# Altium footprint library YQPOWER.PcbLib: 215 footprints (part 2 of 14)
Each footprint in its own frame and in the unit in brackets; x right, y up, seen from the top. Pads: shape width x height; smd on the part's side, far side on the other; paste and mask are expansions set on the pad; w line width, h text height; cw(c..) or ccw(c..) is an arc to the next point about the centre after c.
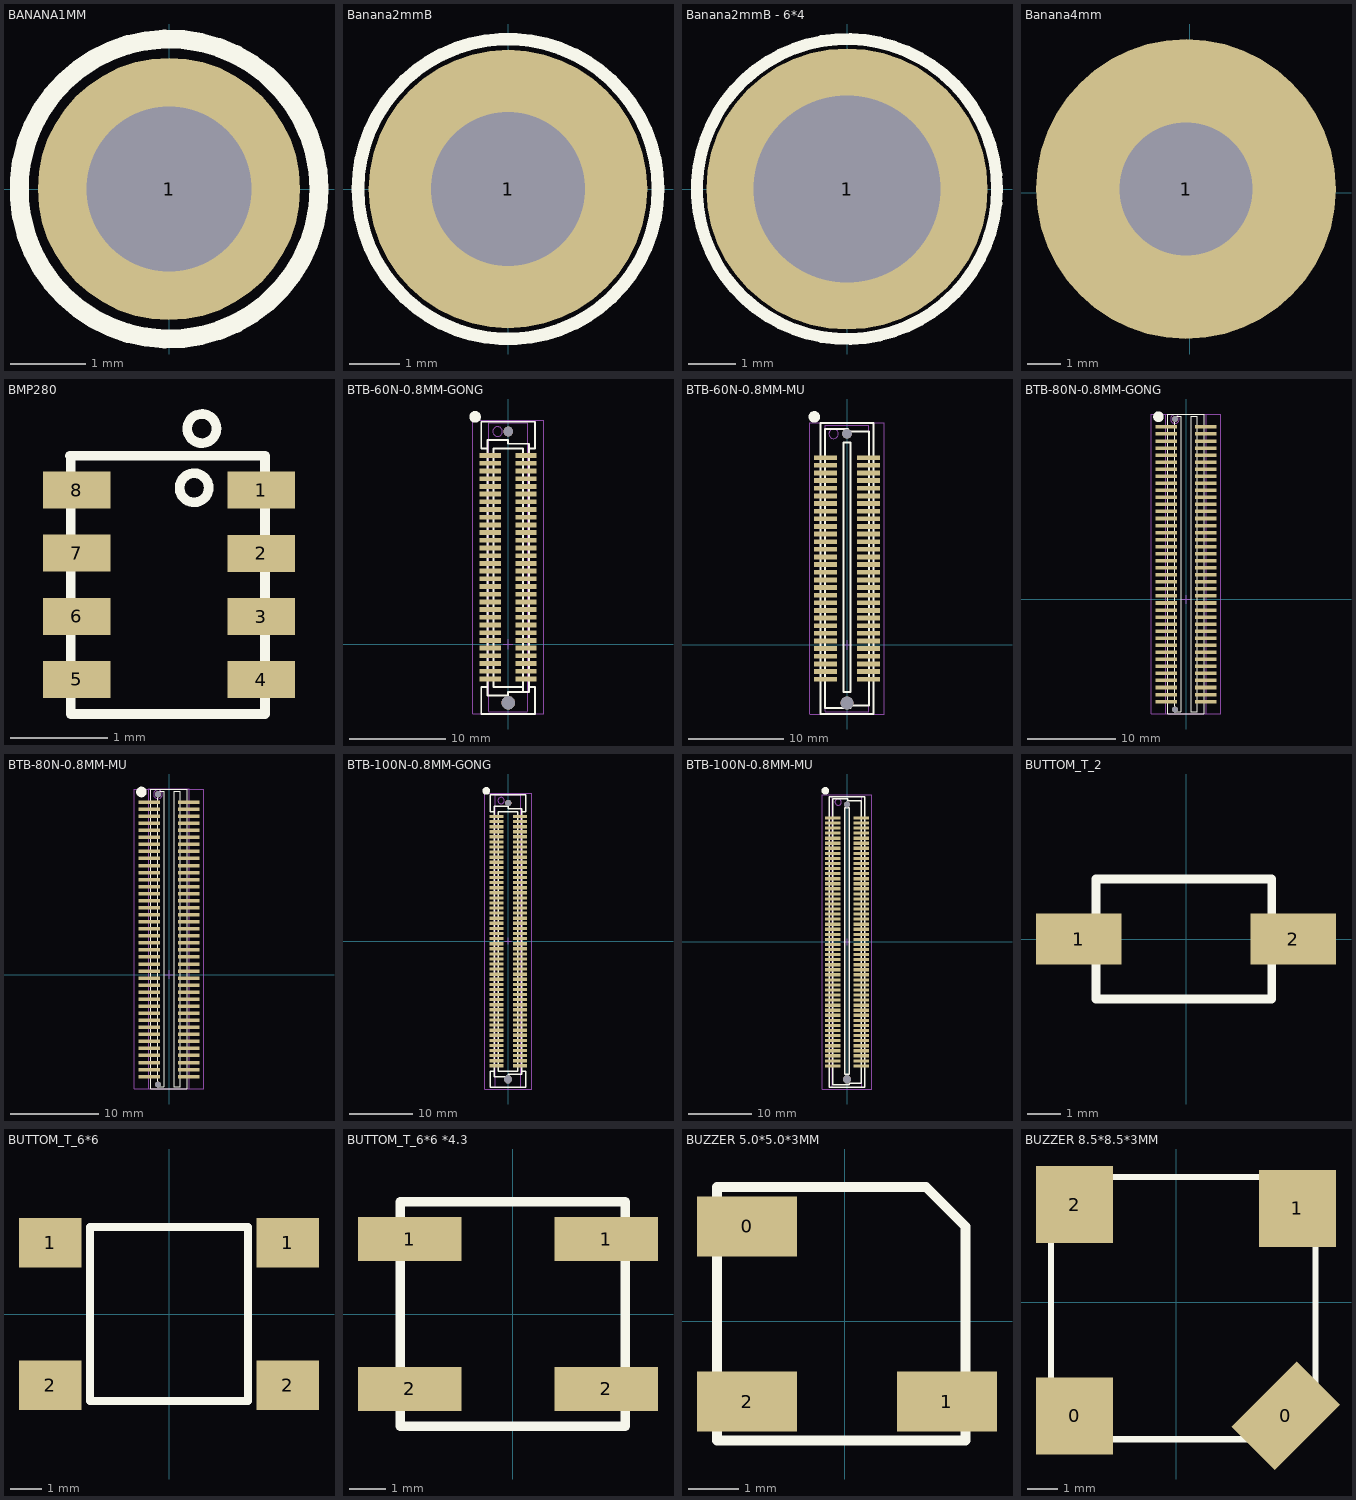
[diagram p1: the footprints below, top view; thin cyan lines are the x and y axes]

## BANANA1MM [mm]
pads (1):
  round 3.5 hole 2.2: 1(0,0)
Top Overlay:
  circle w0.254: c0,0 r2

## Banana2mmB [mm]
pads (1):
  round 5.5 hole 3.05: 1(0,0)
Top Overlay:
  circle w0.254: c0,0 r2.962

## Banana2mmB - 6*4 [mm]
pads (1):
  round 6 hole 4: 1(0,0)
Top Overlay:
  circle w0.254: c0,0 r3.2

## Banana4mm [mm]
pads (1):
  round 9 hole 4: 1(-0.115,0.113)

## BMP280 [mil]
height 100
pads (8):
  rect 27.56x15 smd: 1(109.5,166.4) 2(109.5,140.7) 3(109.5,115.1) 4(109.5,89.5) 5(34.69,89.6) 6(34.69,115.2) 7(34.69,140.8) 8(34.69,166.4)
Top Overlay:
  circle w3.94: c82.28,167.32 r5.91
  circle w3.94: c85.43,191.34 r5.91
  lines w3.94: 31.89,180.31 110.63,180.31 ; 32.28,179.92 32.28,75.59 111.02,75.59 111.02,180.31

## BTB-60N-0.8MM-GONG [mm]
height 5
pads (60):
  rect 2.22x0.5 smd: 1(-1.85,19.6) 2(-1.85,18.8) 3(-1.85,18) 4(-1.85,17.2) 5(-1.85,16.4) 6(-1.85,15.6) 7(-1.85,14.8) 8(-1.85,14) 9(-1.85,13.2) 10(-1.85,12.4) 11(-1.85,11.6) 12(-1.85,10.8) 13(-1.85,10) 14(-1.85,9.2) 15(-1.85,8.4) 16(-1.85,7.6) 17(-1.85,6.8) 18(-1.85,6) 19(-1.85,5.2) 20(-1.85,4.4) 21(-1.85,3.6) 22(-1.85,2.8) 23(-1.85,2) 24(-1.85,1.2) 25(-1.85,0.4) 26(-1.85,-0.4) 27(-1.85,-1.2) 28(-1.85,-2) 29(-1.85,-2.8) 30(-1.85,-3.6) 31(1.85,-3.6) 32(1.85,-2.8) 33(1.85,-2) 34(1.85,-1.2) 35(1.85,-0.4) 36(1.85,0.4) 37(1.85,1.2) 38(1.85,2) 39(1.85,2.8) 40(1.85,3.6) 41(1.85,4.4) 42(1.85,5.2) 43(1.85,6) 44(1.85,6.8) 45(1.85,7.6) 46(1.85,8.4) 47(1.85,9.2) 48(1.85,10) 49(1.85,10.8) 50(1.85,11.6) 51(1.85,12.4) 52(1.85,13.2) 53(1.85,14) 54(1.85,14.8) 55(1.85,15.6) 56(1.85,16.4) 57(1.85,17.2) 58(1.85,18) 59(1.85,18.8) 60(1.85,19.6)
via 0,22.098 diameter 1 hole 1
via 0,-6.096 diameter 1.4 hole 1.4
Top Overlay:
  circle w0.6: c-3.429,23.622 r0.3
  lines w0.2: -2.159,-4.445 -2.794,-4.445 -2.794,-7.239 2.794,-7.239 2.794,-4.445 2.159,-4.445 ; -2.159,20.32 -2.794,20.32 -2.794,23.114 2.794,23.114 2.794,20.32 2.159,20.32 ; 1.524,-4.953 1.524,20.32 -1.524,20.32 -1.524,-4.445 1.524,-4.445 ; -2.159,-5.334 -2.159,21.209 0,21.209 0,20.828 2.159,20.828 2.159,-4.953 0,-4.953 0,-5.334 -2.159,-5.334
Mechanical 13:
  circle w0.1: c-1.1,22.1 r0.5
  lines w0.1: -2,-6.998 2,-6.998 ; -2,-6.985 -2,22.987 2,22.987 2,-6.985
Mechanical 15:
  lines w0.05: -3.7,-7.248 3.7,-7.248 ; -3.7,-7.239 -3.7,23.25 3.7,23.25 3.7,-7.239
  lines w0.1: -0.5,0 0.5,0 ; 0,-0.5 0,0.5
3D body: height 5, standoff 0.1, extent -2,-6.985 2,23

## BTB-60N-0.8MM-MU [mm] "SOP, 60-Leads, Body 45.95x4.55mm, Pitch 0.80mm, IPC Medium Density"
height 5
pads (60):
  rect 2.44x0.5 smd: 1(-2.25,19.6) 2(-2.25,18.8) 3(-2.25,18) 4(-2.25,17.2) 5(-2.25,16.4) 6(-2.25,15.6) 7(-2.25,14.8) 8(-2.25,14) 9(-2.25,13.2) 10(-2.25,12.4) 11(-2.25,11.6) 12(-2.25,10.8) 13(-2.25,10) 14(-2.25,9.2) 15(-2.25,8.4) 16(-2.25,7.6) 17(-2.25,6.8) 18(-2.25,6) 19(-2.25,5.2) 20(-2.25,4.4) 21(-2.25,3.6) 22(-2.25,2.8) 23(-2.25,2) 24(-2.25,1.2) 25(-2.25,0.4) 26(-2.25,-0.4) 27(-2.25,-1.2) 28(-2.25,-2) 29(-2.25,-2.8) 30(-2.25,-3.6) 31(2.25,-3.6) 32(2.25,-2.8) 33(2.25,-2) 34(2.25,-1.2) 35(2.25,-0.4) 36(2.25,0.4) 37(2.25,1.2) 38(2.25,2) 39(2.25,2.8) 40(2.25,3.6) 41(2.25,4.4) 42(2.25,5.2) 43(2.25,6) 44(2.25,6.8) 45(2.25,7.6) 46(2.25,8.4) 47(2.25,9.2) 48(2.25,10) 49(2.25,10.8) 50(2.25,11.6) 51(2.25,12.4) 52(2.25,13.2) 53(2.25,14) 54(2.25,14.8) 55(2.25,15.6) 56(2.25,16.4) 57(2.25,17.2) 58(2.25,18) 59(2.25,18.8) 60(2.25,19.6)
via 0,-6.096 diameter 1.4 hole 1.4
via 0,22.098 diameter 1 hole 1
Top Overlay:
  circle w0.6: c-3.429,23.876 r0.3
  lines w0.2: -2.286,-6.606 0.381,-6.606 0.381,-6.352 2.286,-6.352 ; -2.286,-6.604 -2.286,22.352 -2.286,22.606 0.127,22.606 0.127,22.352 2.286,22.352 2.286,-6.35 ; -0.381,-4.826 -0.381,21.209 0.381,21.209 0.381,-4.953 ; -0.254,-4.955 -0.381,-4.955 0.381,-4.955 ; -2.794,-7.239 2.794,-7.239 2.794,23.241 -2.794,23.241 -2.794,-7.239
Mechanical 13:
  circle w0.1: c-1.4,22.1 r0.5
  lines w0.1: -2.3,-7 2.3,-7 ; -2.3,-6.985 -2.3,22.987 2.3,22.987 2.3,-6.985
Mechanical 15:
  lines w0.05: -3.925,-7.25 3.925,-7.25 ; -3.925,-7.239 -3.925,23.25 3.925,23.25 3.925,-7.239
  lines w0.1: -0.5,0 0.5,0 ; 0,-0.5 0,0.5
3D body: height 5, standoff 0.1, extent -2.3,-6.985 2.3,23

## BTB-80N-0.8MM-GONG [mm] "SOP, 100-Leads, Body 45.95x4.55mm, Pitch 0.80mm, IPC Medium Density"
height 5
pads (80):
  rect 2.44x0.4 smd: 1(-2.25,19.6) 2(-2.25,18.8) 3(-2.25,18) 4(-2.25,17.2) 5(-2.25,16.4) 6(-2.25,15.6) 7(-2.25,14.8) 8(-2.25,14) 9(-2.25,13.2) 10(-2.25,12.4) 11(-2.25,11.6) 12(-2.25,10.8) 13(-2.25,10) 14(-2.25,9.2) 15(-2.25,8.4) 16(-2.25,7.6) 17(-2.25,6.8) 18(-2.25,6) 19(-2.25,5.2) 20(-2.25,4.4) 21(-2.25,3.6) 22(-2.25,2.8) 23(-2.25,2) 24(-2.25,1.2) 25(-2.25,0.4) 26(-2.25,-0.4) 27(-2.25,-1.2) 28(-2.25,-2) 29(-2.25,-2.8) 30(-2.25,-3.6) 31(-2.25,-4.4) 32(-2.25,-5.2) 33(-2.25,-6) 34(-2.25,-6.8) 35(-2.25,-7.6) 36(-2.25,-8.4) 37(-2.25,-9.2) 38(-2.25,-10) 39(-2.25,-10.8) 40(-2.25,-11.6) 41(2.25,-11.6) 42(2.25,-10.8) 43(2.25,-10) 44(2.25,-9.2) 45(2.25,-8.4) 46(2.25,-7.6) 47(2.25,-6.8) 48(2.25,-6) 49(2.25,-5.2) 50(2.25,-4.4) 51(2.25,-3.6) 52(2.25,-2.8) 53(2.25,-2) 54(2.25,-1.2) 55(2.25,-0.4) 56(2.25,0.4) 57(2.25,1.2) 58(2.25,2) 59(2.25,2.8) 60(2.25,3.6) 61(2.25,4.4) 62(2.25,5.2) 63(2.25,6) 64(2.25,6.8) 65(2.25,7.6) 66(2.25,8.4) 67(2.25,9.2) 68(2.25,10) 69(2.25,10.8) 70(2.25,11.6) 71(2.25,12.4) 72(2.25,13.2) 73(2.25,14) 74(2.25,14.8) 75(2.25,15.6) 76(2.25,16.4) 77(2.25,17.2) 78(2.25,18) 79(2.25,18.8) 80(2.25,19.6)
via -1.25,-12.5 diameter 0.7 hole 0.7
via -1.25,20.5 diameter 0.7 hole 0.7
Top Overlay:
  circle w0.6: c-3.13,20.76 r0.3
  lines w0.1: -2.05,-13.01 2.02,-13.01 2.02,21.07 -2.05,21.07 -2.05,-13.01 ; -1.31,-12.75 -1.31,20.83 -0.57,20.83 -0.57,-12.75 -1.31,-12.75 ; 0.52,-12.75 0.52,20.83 1.285,20.83 1.285,-12.75 0.52,-12.75
Mechanical 13:
  circle w0.1: c-1.25,20.5 r0.5
  lines w0.1: -2.3,-12.99 2.3,-12.99 2.3,21.06 -2.3,21.06 -2.3,-12.99
Mechanical 15:
  lines w0.05: -3.925,-12.97 3.925,-12.97 3.925,21.07 -3.925,21.07 -3.925,-12.97
  lines w0.1: -0.5,0 0.5,0 ; 0,-0.5 0,0.5
3D body: height 5, standoff 0.1, extent -2.3,-12.99 2.3,21.07

## BTB-80N-0.8MM-MU [mm] "SOP, 100-Leads, Body 45.95x4.55mm, Pitch 0.80mm, IPC Medium Density"
height 5
pads (80):
  rect 2.44x0.4 smd: 1(-2.25,19.6) 2(-2.25,18.8) 3(-2.25,18) 4(-2.25,17.2) 5(-2.25,16.4) 6(-2.25,15.6) 7(-2.25,14.8) 8(-2.25,14) 9(-2.25,13.2) 10(-2.25,12.4) 11(-2.25,11.6) 12(-2.25,10.8) 13(-2.25,10) 14(-2.25,9.2) 15(-2.25,8.4) 16(-2.25,7.6) 17(-2.25,6.8) 18(-2.25,6) 19(-2.25,5.2) 20(-2.25,4.4) 21(-2.25,3.6) 22(-2.25,2.8) 23(-2.25,2) 24(-2.25,1.2) 25(-2.25,0.4) 26(-2.25,-0.4) 27(-2.25,-1.2) 28(-2.25,-2) 29(-2.25,-2.8) 30(-2.25,-3.6) 31(-2.25,-4.4) 32(-2.25,-5.2) 33(-2.25,-6) 34(-2.25,-6.8) 35(-2.25,-7.6) 36(-2.25,-8.4) 37(-2.25,-9.2) 38(-2.25,-10) 39(-2.25,-10.8) 40(-2.25,-11.6) 41(2.25,-11.6) 42(2.25,-10.8) 43(2.25,-10) 44(2.25,-9.2) 45(2.25,-8.4) 46(2.25,-7.6) 47(2.25,-6.8) 48(2.25,-6) 49(2.25,-5.2) 50(2.25,-4.4) 51(2.25,-3.6) 52(2.25,-2.8) 53(2.25,-2) 54(2.25,-1.2) 55(2.25,-0.4) 56(2.25,0.4) 57(2.25,1.2) 58(2.25,2) 59(2.25,2.8) 60(2.25,3.6) 61(2.25,4.4) 62(2.25,5.2) 63(2.25,6) 64(2.25,6.8) 65(2.25,7.6) 66(2.25,8.4) 67(2.25,9.2) 68(2.25,10) 69(2.25,10.8) 70(2.25,11.6) 71(2.25,12.4) 72(2.25,13.2) 73(2.25,14) 74(2.25,14.8) 75(2.25,15.6) 76(2.25,16.4) 77(2.25,17.2) 78(2.25,18) 79(2.25,18.8) 80(2.25,19.6)
via -1.25,-12.5 diameter 0.7 hole 0.7
via -1.25,20.5 diameter 0.7 hole 0.7
Top Overlay:
  circle w0.6: c-3.13,20.76 r0.3
  lines w0.1: -2.05,-13.01 2.02,-13.01 2.02,21.07 -2.05,21.07 -2.05,-13.01 ; -1.31,-12.75 -1.31,20.83 -0.57,20.83 -0.57,-12.75 -1.31,-12.75 ; 0.52,-12.75 0.52,20.83 1.285,20.83 1.285,-12.75 0.52,-12.75
Mechanical 13:
  circle w0.1: c-1.25,20.5 r0.5
  lines w0.1: -2.3,-12.96 2.3,-12.96 2.3,21.1 -2.3,21.1 -2.3,-12.96
Mechanical 15:
  lines w0.05: -3.925,-13.01 3.925,-13.01 3.925,21.07 -3.925,21.07 -3.925,-13.01
  lines w0.1: -0.5,0 0.5,0 ; 0,-0.5 0,0.5

## BTB-100N-0.8MM-GONG [mm]
height 5
pads (100):
  rect 2.22x0.5 smd: 1(-1.85,19.6) 2(-1.85,18.8) 3(-1.85,18) 4(-1.85,17.2) 5(-1.85,16.4) 6(-1.85,15.6) 7(-1.85,14.8) 8(-1.85,14) 9(-1.85,13.2) 10(-1.85,12.4) 11(-1.85,11.6) 12(-1.85,10.8) 13(-1.85,10) 14(-1.85,9.2) 15(-1.85,8.4) 16(-1.85,7.6) 17(-1.85,6.8) 18(-1.85,6) 19(-1.85,5.2) 20(-1.85,4.4) 21(-1.85,3.6) 22(-1.85,2.8) 23(-1.85,2) 24(-1.85,1.2) 25(-1.85,0.4) 26(-1.85,-0.4) 27(-1.85,-1.2) 28(-1.85,-2) 29(-1.85,-2.8) 30(-1.85,-3.6) 31(-1.85,-4.4) 32(-1.85,-5.2) 33(-1.85,-6) 34(-1.85,-6.8) 35(-1.85,-7.6) 36(-1.85,-8.4) 37(-1.85,-9.2) 38(-1.85,-10) 39(-1.85,-10.8) 40(-1.85,-11.6) 41(-1.85,-12.4) 42(-1.85,-13.2) 43(-1.85,-14) 44(-1.85,-14.8) 45(-1.85,-15.6) 46(-1.85,-16.4) 47(-1.85,-17.2) 48(-1.85,-18) 49(-1.85,-18.8) 50(-1.85,-19.6) 51(1.85,-19.6) 52(1.85,-18.8) 53(1.85,-18) 54(1.85,-17.2) 55(1.85,-16.4) 56(1.85,-15.6) 57(1.85,-14.8) 58(1.85,-14) 59(1.85,-13.2) 60(1.85,-12.4) 61(1.85,-11.6) 62(1.85,-10.8) 63(1.85,-10) 64(1.85,-9.2) 65(1.85,-8.4) 66(1.85,-7.6) 67(1.85,-6.8) 68(1.85,-6) 69(1.85,-5.2) 70(1.85,-4.4) 71(1.85,-3.6) 72(1.85,-2.8) 73(1.85,-2) 74(1.85,-1.2) 75(1.85,-0.4) 76(1.85,0.4) 77(1.85,1.2) 78(1.85,2) 79(1.85,2.8) 80(1.85,3.6) 81(1.85,4.4) 82(1.85,5.2) 83(1.85,6) 84(1.85,6.8) 85(1.85,7.6) 86(1.85,8.4) 87(1.85,9.2) 88(1.85,10) 89(1.85,10.8) 90(1.85,11.6) 91(1.85,12.4) 92(1.85,13.2) 93(1.85,14) 94(1.85,14.8) 95(1.85,15.6) 96(1.85,16.4) 97(1.85,17.2) 98(1.85,18) 99(1.85,18.8) 100(1.85,19.6)
via 0,-21.717 diameter 1.3 hole 1.3
via 0,21.717 diameter 1 hole 1
Top Overlay:
  circle w0.6: c-3.429,23.622 r0.3
  lines w0.2: -2.159,-20.447 -2.794,-20.447 -2.794,-22.987 2.794,-22.987 2.794,-20.447 2.159,-20.447 ; -2.159,20.32 -2.794,20.32 -2.794,22.987 2.794,22.987 2.794,20.32 2.159,20.32 ; -2.159,-21.336 0,-21.336 0,-20.955 2.159,-20.955 2.159,20.828 0,20.828 0,21.209 -2.159,21.209 -2.159,-21.336 ; -1.524,-20.447 -1.524,20.32 1.524,20.32 1.524,-20.447 -1.524,-20.447
Mechanical 13:
  circle w0.1: c-1.1,22.1 r0.5
  lines w0.1: -2,-23 2,-23 2,23 -2,23 -2,-23
Mechanical 15:
  lines w0.05: -3.7,-23.25 3.7,-23.25 3.7,23.25 -3.7,23.25 -3.7,-23.25
  lines w0.1: -0.5,0 0.5,0 ; 0,-0.5 0,0.5
3D body: height 5, standoff 0.1, extent -2,-23 2,23

## BTB-100N-0.8MM-MU [mm] "SOP, 100-Leads, Body 45.95x4.55mm, Pitch 0.80mm, IPC Medium Density"
height 5
pads (100):
  rect 2.44x0.5 smd: 1(-2.25,19.6) 2(-2.25,18.8) 3(-2.25,18) 4(-2.25,17.2) 5(-2.25,16.4) 6(-2.25,15.6) 7(-2.25,14.8) 8(-2.25,14) 9(-2.25,13.2) 10(-2.25,12.4) 11(-2.25,11.6) 12(-2.25,10.8) 13(-2.25,10) 14(-2.25,9.2) 15(-2.25,8.4) 16(-2.25,7.6) 17(-2.25,6.8) 18(-2.25,6) 19(-2.25,5.2) 20(-2.25,4.4) 21(-2.25,3.6) 22(-2.25,2.8) 23(-2.25,2) 24(-2.25,1.2) 25(-2.25,0.4) 26(-2.25,-0.4) 27(-2.25,-1.2) 28(-2.25,-2) 29(-2.25,-2.8) 30(-2.25,-3.6) 31(-2.25,-4.4) 32(-2.25,-5.2) 33(-2.25,-6) 34(-2.25,-6.8) 35(-2.25,-7.6) 36(-2.25,-8.4) 37(-2.25,-9.2) 38(-2.25,-10) 39(-2.25,-10.8) 40(-2.25,-11.6) 41(-2.25,-12.4) 42(-2.25,-13.2) 43(-2.25,-14) 44(-2.25,-14.8) 45(-2.25,-15.6) 46(-2.25,-16.4) 47(-2.25,-17.2) 48(-2.25,-18) 49(-2.25,-18.8) 50(-2.25,-19.6) 51(2.25,-19.6) 52(2.25,-18.8) 53(2.25,-18) 54(2.25,-17.2) 55(2.25,-16.4) 56(2.25,-15.6) 57(2.25,-14.8) 58(2.25,-14) 59(2.25,-13.2) 60(2.25,-12.4) 61(2.25,-11.6) 62(2.25,-10.8) 63(2.25,-10) 64(2.25,-9.2) 65(2.25,-8.4) 66(2.25,-7.6) 67(2.25,-6.8) 68(2.25,-6) 69(2.25,-5.2) 70(2.25,-4.4) 71(2.25,-3.6) 72(2.25,-2.8) 73(2.25,-2) 74(2.25,-1.2) 75(2.25,-0.4) 76(2.25,0.4) 77(2.25,1.2) 78(2.25,2) 79(2.25,2.8) 80(2.25,3.6) 81(2.25,4.4) 82(2.25,5.2) 83(2.25,6) 84(2.25,6.8) 85(2.25,7.6) 86(2.25,8.4) 87(2.25,9.2) 88(2.25,10) 89(2.25,10.8) 90(2.25,11.6) 91(2.25,12.4) 92(2.25,13.2) 93(2.25,14) 94(2.25,14.8) 95(2.25,15.6) 96(2.25,16.4) 97(2.25,17.2) 98(2.25,18) 99(2.25,18.8) 100(2.25,19.6)
via 0,21.717 diameter 1 hole 1
via 0,-21.717 diameter 1.3 hole 1.3
Top Overlay:
  circle w0.6: c-3.429,23.876 r0.3
  lines w0.2: -0.254,-20.955 -0.381,-20.955 ; -0.381,-20.955 -0.381,21.209 0.381,21.209 0.381,-20.955 -0.381,-20.955 ; -2.794,-22.987 2.794,-22.987 2.794,22.987 -2.794,22.987 -2.794,-22.987 ; -2.286,-22.606 -2.286,22.352 -2.286,22.606 0.127,22.606 0.127,22.352 2.286,22.352 2.286,-22.352 0.381,-22.352 0.381,-22.606 -2.286,-22.606
Mechanical 13:
  circle w0.1: c-1.4,22.1 r0.5
  lines w0.1: -2.3,-23 -2.3,23 2.3,23 2.3,-23 -2.3,-23
Mechanical 15:
  lines w0.05: -3.925,-23.25 -3.925,23.25 3.925,23.25 3.925,-23.25 -3.925,-23.25
  lines w0.1: -0.5,0 0.5,0 ; 0,-0.5 0,0.5
3D body: height 5, standoff 0.1, extent -2.3,-23 2.3,23

## BUTTOM_T_2 [mil]
pads (2):
  rect 100x60 smd: 1(-125,0) 2(125,0)
Top Overlay:
  lines w10: -105,-70 100,-70 100,70 -105,70 -105,-70

## BUTTOM_T_6*6 [mm]
pads (4):
  rect 2x1.6 smd: 1(-3.81,2.286) 1(3.81,2.286) 2(-3.81,-2.286) 2(3.81,-2.286)
Top Overlay:
  lines w0.254: -2.54,-2.794 2.54,-2.794 2.54,2.794 -2.54,2.794 -2.54,0.254 -2.54,-2.794

## BUTTOM_T_6*6 *4.3 [mm]
pads (4):
  rect 2.8x1.2 smd: 1(-2.794,2.032) 1(2.54,2.032) 2(-2.794,-2.032) 2(2.54,-2.032)
Top Overlay:
  lines w0.254: -3.048,-3.048 -3.048,0.254 -3.048,3.048 3.048,3.048 3.048,-3.048 -3.048,-3.048

## BUZZER 5.0*5.0*3MM [mm] "无源蜂鸣器"
height 3
pads (3):
  rect 2x1.2 smd: 0(-1.95,1.89) 1(2.05,-1.61) 2(-1.95,-1.61)
Top Overlay:
  lines w0.2: -2.55,-2.394 2.42,-2.394 2.42,1.89 1.63,2.68 -2.55,2.68 -2.55,-2.394

## BUZZER 8.5*8.5*3MM [mm] "无源蜂鸣器"
height 3
pads (4):
  rect 2.5x2.5 smd: 0(-3.302,-3.683) 1(3.937,3.048) 2(-3.302,3.175)
  rect 3x2 smd rot 45: 0(3.556,-3.683)
Top Overlay:
  lines w0.2: -4.064,-4.445 3.048,-4.445 4.52,-2.973 4.52,4.064 ; -4.064,-4.436 -4.064,4.064 4.436,4.064